# Altium schematic symbol library jlcpcb_2025_04_inductors_extended_0603.schlib: 1269 symbols (part 4 of 7) (continued)
## LQW18AN24NJ00D
designator L?  Inductance: 24nH
Inductor, 24nH, ±5%, 210mΩ, 500mA, SMD 0603; Manufacturer: Murata Electronics; Manufacturer Part Number: LQW18AN24NJ00D; Package Size: 0603; JLCPCB Basic Part: No; JLCPCB Part Number: C701183; Supplier 1: LCSC; Category: Inductors; Supplier Part Number 1: C701183; Tolerance: ±5%; Rated Current: 500mA; DC Resistance: 210mΩ; RoHS: Yes; ComponentLink1Description: Datasheet; ComponentLink1URL: https://wmsc.lcsc.com/wmsc/upload/file/pdf/v2/lcsc/2009291135_Murata-Electronics-LQW18AN24NJ00D_C701183.pdf; ComponentLink2Description: JLCPCB Part URL; ComponentLink2URL: https://jlcpcb.com/partdetail/C701183; ComponentLink3Description: LCSC Part URL; ComponentLink3URL: https://lcsc.com/product-detail/Power-Inductors_Murata-Electronics-Murata-Electronics-LQW18AN24NJ00D_C701183.html
footprint IND-0603 (0603 (1608M) Inductor)
pins: 1, 2

## LQW18AN27NG00D
designator L?  Inductance: 27nH
Inductor, 27nH, ±2%, 210mΩ, SMD 0603; Manufacturer: Murata Electronics; Manufacturer Part Number: LQW18AN27NG00D; Self-Resonant Frequency: 3.7GHz; Q Factor: 40@250MHz; Package Size: 0603; JLCPCB Basic Part: No; JLCPCB Part Number: C148128; Supplier 1: LCSC; Category: Inductors; Supplier Part Number 1: C148128; Tolerance: ±2%; DC Resistance: 210mΩ; RoHS: Yes; ComponentLink1Description: Datasheet; ComponentLink1URL: https://wmsc.lcsc.com/wmsc/upload/file/pdf/v2/lcsc/2304140030_Murata-Electronics-LQW18AN27NG00D_C148128.pdf; ComponentLink2Description: JLCPCB Part URL; ComponentLink2URL: https://jlcpcb.com/partdetail/C148128; ComponentLink3Description: LCSC Part URL; ComponentLink3URL: https://lcsc.com/product-detail/Inductors-SMD_Murata-Electronics-Murata-Electronics-LQW18AN27NG00D_C148128.html
footprint IND-0603 (0603 (1608M) Inductor)
pins: 1, 2

## LQW18AN27NG10D
designator L?  Inductance: 27nH
Inductor, 27nH, ±2%, 116mΩ, 590mA, SMD 0603; Manufacturer: Murata Electronics; Manufacturer Part Number: LQW18AN27NG10D; Package Size: 0603; JLCPCB Basic Part: No; JLCPCB Part Number: C701182; Supplier 1: LCSC; Category: Inductors; Supplier Part Number 1: C701182; Tolerance: ±2%; Rated Current: 590mA; DC Resistance: 116mΩ; RoHS: Yes; ComponentLink1Description: Datasheet; ComponentLink1URL: https://wmsc.lcsc.com/wmsc/upload/file/pdf/v2/lcsc/2012161910_Murata-Electronics-LQW18AN27NG10D_C701182.pdf; ComponentLink2Description: JLCPCB Part URL; ComponentLink2URL: https://jlcpcb.com/partdetail/C701182; ComponentLink3Description: LCSC Part URL; ComponentLink3URL: https://lcsc.com/product-detail/Power-Inductors_Murata-Electronics-Murata-Electronics-LQW18AN27NG10D_C701182.html
footprint IND-0603 (0603 (1608M) Inductor)
pins: 1, 2

## LQW18AN27NJ00D
designator L?  Inductance: 27nH
Inductor, 27nH, ±5%, 210mΩ, 440mA, SMD 0603; Manufacturer: Murata Electronics; Manufacturer Part Number: LQW18AN27NJ00D; Self-Resonant Frequency: 3.7GHz; Q Factor: 40@250MHz; Package Size: 0603; JLCPCB Basic Part: No; JLCPCB Part Number: C98072; Supplier 1: LCSC; Category: Inductors; Supplier Part Number 1: C98072; Tolerance: ±5%; Rated Current: 440mA; DC Resistance: 210mΩ; RoHS: Yes; ComponentLink1Description: Datasheet; ComponentLink1URL: https://wmsc.lcsc.com/wmsc/upload/file/pdf/v2/lcsc/2304140030_Murata-Electronics-LQW18AN27NJ00D_C98072.pdf; ComponentLink2Description: JLCPCB Part URL; ComponentLink2URL: https://jlcpcb.com/partdetail/C98072; ComponentLink3Description: LCSC Part URL; ComponentLink3URL: https://lcsc.com/product-detail/Inductors-SMD_Murata-Electronics-Murata-Electronics-LQW18AN27NJ00D_C98072.html
footprint IND-0603 (0603 (1608M) Inductor)
pins: 1, 2

## LQW18AN30NG00D
designator L?  Inductance: 30nH
Inductor, 30nH, ±2%, 230mΩ, 420mA, SMD 0603; Manufacturer: Murata Electronics; Manufacturer Part Number: LQW18AN30NG00D; Package Size: 0603; JLCPCB Basic Part: No; JLCPCB Part Number: C701195; Supplier 1: LCSC; Category: Inductors; Supplier Part Number 1: C701195; Tolerance: ±2%; Rated Current: 420mA; DC Resistance: 230mΩ; RoHS: Yes; ComponentLink1Description: Datasheet; ComponentLink1URL: https://wmsc.lcsc.com/wmsc/upload/file/pdf/v2/lcsc/2010201503_Murata-Electronics-LQW18AN30NG00D_C701195.pdf; ComponentLink2Description: JLCPCB Part URL; ComponentLink2URL: https://jlcpcb.com/partdetail/C701195; ComponentLink3Description: LCSC Part URL; ComponentLink3URL: https://lcsc.com/product-detail/Power-Inductors_Murata-Electronics-Murata-Electronics-LQW18AN30NG00D_C701195.html
footprint IND-0603 (0603 (1608M) Inductor)
pins: 1, 2

## LQW18AN30NJ00D
designator L?  Inductance: 30nH
Inductor, 30nH, ±5%, 230mΩ, 420mA, SMD 0603; Manufacturer: Murata Electronics; Manufacturer Part Number: LQW18AN30NJ00D; Package Size: 0603; JLCPCB Basic Part: No; JLCPCB Part Number: C185513; Supplier 1: LCSC; Category: Inductors; Supplier Part Number 1: C185513; Tolerance: ±5%; Rated Current: 420mA; DC Resistance: 230mΩ; RoHS: Yes; ComponentLink1Description: Datasheet; ComponentLink1URL: https://wmsc.lcsc.com/wmsc/upload/file/pdf/v2/lcsc/2010101433_Murata-Electronics-LQW18AN30NJ00D_C185513.pdf; ComponentLink2Description: JLCPCB Part URL; ComponentLink2URL: https://jlcpcb.com/partdetail/C185513; ComponentLink3Description: LCSC Part URL; ComponentLink3URL: https://lcsc.com/product-detail/Power-Inductors_Murata-Electronics-Murata-Electronics-LQW18AN30NJ00D_C185513.html
footprint IND-0603 (0603 (1608M) Inductor)
pins: 1, 2

## LQW18AN33NG00D
designator L?  Inductance: 33nH
Inductor, 33nH, ±2%, 230mΩ, 420mA, SMD 0603; Manufacturer: Murata Electronics; Manufacturer Part Number: LQW18AN33NG00D; Self-Resonant Frequency: 3.2GHz; Q Factor: 40@250MHz; Package Size: 0603; JLCPCB Basic Part: No; JLCPCB Part Number: C98073; Supplier 1: LCSC; Category: Inductors; Supplier Part Number 1: C98073; Tolerance: ±2%; Rated Current: 420mA; DC Resistance: 230mΩ; RoHS: Yes; ComponentLink1Description: Datasheet; ComponentLink1URL: https://wmsc.lcsc.com/wmsc/upload/file/pdf/v2/lcsc/2304140030_Murata-Electronics-LQW18AN33NG00D_C98073.pdf; ComponentLink2Description: JLCPCB Part URL; ComponentLink2URL: https://jlcpcb.com/partdetail/C98073; ComponentLink3Description: LCSC Part URL; ComponentLink3URL: https://lcsc.com/product-detail/Inductors-SMD_Murata-Electronics-Murata-Electronics-LQW18AN33NG00D_C98073.html
footprint IND-0603 (0603 (1608M) Inductor)
pins: 1, 2

## LQW18AN33NJ00D
designator L?  Inductance: 33nH
Inductor, 33nH, ±5%, 230mΩ, 420mA, SMD 0603; Manufacturer: Murata Electronics; Manufacturer Part Number: LQW18AN33NJ00D; Self-Resonant Frequency: 3.2GHz; Q Factor: 40@250MHz; Package Size: 0603; JLCPCB Basic Part: No; JLCPCB Part Number: C98074; Supplier 1: LCSC; Category: Inductors; Supplier Part Number 1: C98074; Tolerance: ±5%; Rated Current: 420mA; DC Resistance: 230mΩ; RoHS: Yes; ComponentLink1Description: Datasheet; ComponentLink1URL: https://wmsc.lcsc.com/wmsc/upload/file/pdf/v2/lcsc/2304140030_Murata-Electronics-LQW18AN33NJ00D_C98074.pdf; ComponentLink2Description: JLCPCB Part URL; ComponentLink2URL: https://jlcpcb.com/partdetail/C98074; ComponentLink3Description: LCSC Part URL; ComponentLink3URL: https://lcsc.com/product-detail/Inductors-SMD_Murata-Electronics-Murata-Electronics-LQW18AN33NJ00D_C98074.html
footprint IND-0603 (0603 (1608M) Inductor)
pins: 1, 2

## LQW18AN33NJ10D
designator L?  Inductance: 33nH
Inductor, 33nH, ±5%, 132mΩ, 550mA, SMD 0603; Manufacturer: Murata Electronics; Manufacturer Part Number: LQW18AN33NJ10D; Package Size: 0603; JLCPCB Basic Part: No; JLCPCB Part Number: C701171; Supplier 1: LCSC; Category: Inductors; Supplier Part Number 1: C701171; Tolerance: ±5%; Rated Current: 550mA; DC Resistance: 132mΩ; RoHS: Yes; ComponentLink1Description: Datasheet; ComponentLink1URL: https://wmsc.lcsc.com/wmsc/upload/file/pdf/v2/lcsc/2009241508_Murata-Electronics-LQW18AN33NJ10D_C701171.pdf; ComponentLink2Description: JLCPCB Part URL; ComponentLink2URL: https://jlcpcb.com/partdetail/C701171; ComponentLink3Description: LCSC Part URL; ComponentLink3URL: https://lcsc.com/product-detail/Power-Inductors_Murata-Electronics-Murata-Electronics-LQW18AN33NJ10D_C701171.html
footprint IND-0603 (0603 (1608M) Inductor)
pins: 1, 2

## LQW18AN36NG00D
designator L?  Inductance: 36nH
Inductor, 36nH, ±2%, 260mΩ, SMD 0603; Manufacturer: Murata Electronics; Manufacturer Part Number: LQW18AN36NG00D; Self-Resonant Frequency: 2.9GHz; Q Factor: 40@250MHz; Package Size: 0603; JLCPCB Basic Part: No; JLCPCB Part Number: C113124; Supplier 1: LCSC; Category: Inductors; Supplier Part Number 1: C113124; Tolerance: ±2%; DC Resistance: 260mΩ; RoHS: Yes; ComponentLink1Description: Datasheet; ComponentLink1URL: https://wmsc.lcsc.com/wmsc/upload/file/pdf/v2/lcsc/2304140030_Murata-Electronics-LQW18AN36NG00D_C113124.pdf; ComponentLink2Description: JLCPCB Part URL; ComponentLink2URL: https://jlcpcb.com/partdetail/C113124; ComponentLink3Description: LCSC Part URL; ComponentLink3URL: https://lcsc.com/product-detail/Inductors-SMD_Murata-Electronics-Murata-Electronics-LQW18AN36NG00D_C113124.html
footprint IND-0603 (0603 (1608M) Inductor)
pins: 1, 2

## LQW18AN36NJ00D
designator L?  Inductance: 36nH
Inductor, 36nH, ±5%, 260mΩ, 400mA, SMD 0603; Manufacturer: Murata Electronics; Manufacturer Part Number: LQW18AN36NJ00D; Package Size: 0603; JLCPCB Basic Part: No; JLCPCB Part Number: C440242; Supplier 1: LCSC; Category: Inductors; Supplier Part Number 1: C440242; Tolerance: ±5%; Rated Current: 400mA; DC Resistance: 260mΩ; RoHS: Yes; ComponentLink1Description: Datasheet; ComponentLink1URL: https://wmsc.lcsc.com/wmsc/upload/file/pdf/v2/lcsc/2304140030_Murata-Electronics-LQW18AN36NJ00D_C440242.pdf; ComponentLink2Description: JLCPCB Part URL; ComponentLink2URL: https://jlcpcb.com/partdetail/C440242; ComponentLink3Description: LCSC Part URL; ComponentLink3URL: https://lcsc.com/product-detail/Power-Inductors_Murata-Electronics-Murata-Electronics-LQW18AN36NJ00D_C440242.html
footprint IND-0603 (0603 (1608M) Inductor)
pins: 1, 2

## LQW18AN39NG00D
designator L?  Inductance: 39nH
Inductor, 39nH, ±2%, 260mΩ, 400mA, SMD 0603; Manufacturer: Murata Electronics; Manufacturer Part Number: LQW18AN39NG00D; Self-Resonant Frequency: 2.8GHz; Q Factor: 40@250MHz; Package Size: 0603; JLCPCB Basic Part: No; JLCPCB Part Number: C86134; Supplier 1: LCSC; Category: Inductors; Supplier Part Number 1: C86134; Tolerance: ±2%; Rated Current: 400mA; DC Resistance: 260mΩ; RoHS: Yes; ComponentLink1Description: Datasheet; ComponentLink1URL: https://wmsc.lcsc.com/wmsc/upload/file/pdf/v2/lcsc/1810311111_Murata-Electronics-LQW18AN39NG00D_C86134.pdf; ComponentLink2Description: JLCPCB Part URL; ComponentLink2URL: https://jlcpcb.com/partdetail/C86134; ComponentLink3Description: LCSC Part URL; ComponentLink3URL: https://lcsc.com/product-detail/Inductors-SMD_Murata-Electronics-Murata-Electronics-LQW18AN39NG00D_C86134.html
footprint IND-0603 (0603 (1608M) Inductor)
pins: 1, 2

## LQW18AN39NG80D
designator L?  Inductance: 39nH
Inductor, 39nH, ±2%, 160mΩ, 1A, SMD 0603; Manufacturer: Murata Electronics; Manufacturer Part Number: LQW18AN39NG80D; Package Size: 0603; JLCPCB Basic Part: No; JLCPCB Part Number: C2042966; Supplier 1: LCSC; Category: Inductors; Supplier Part Number 1: C2042966; Tolerance: ±2%; Rated Current: 1A; DC Resistance: 160mΩ; RoHS: Yes; ComponentLink1Description: Datasheet; ComponentLink1URL: https://wmsc.lcsc.com/wmsc/upload/file/pdf/v2/lcsc/2304140030_Murata-Electronics-LQW18AN39NG80D_C2042966.pdf; ComponentLink2Description: JLCPCB Part URL; ComponentLink2URL: https://jlcpcb.com/partdetail/C2042966; ComponentLink3Description: LCSC Part URL; ComponentLink3URL: https://lcsc.com/product-detail/Power-Inductors_Murata-Electronics-Murata-Electronics-LQW18AN39NG80D_C2042966.html
footprint IND-0603 (0603 (1608M) Inductor)
pins: 1, 2

## LQW18AN39NJ00D
designator L?  Inductance: 39nH
Inductor, 39nH, ±5%, 260mΩ, SMD 0603; Manufacturer: Murata Electronics; Manufacturer Part Number: LQW18AN39NJ00D; Self-Resonant Frequency: 2.8GHz; Q Factor: 40@250MHz; Package Size: 0603; JLCPCB Basic Part: No; JLCPCB Part Number: C98075; Supplier 1: LCSC; Category: Inductors; Supplier Part Number 1: C98075; Tolerance: ±5%; DC Resistance: 260mΩ; RoHS: Yes; ComponentLink1Description: Datasheet; ComponentLink1URL: https://wmsc.lcsc.com/wmsc/upload/file/pdf/v2/lcsc/2304140030_Murata-Electronics-LQW18AN39NJ00D_C98075.pdf; ComponentLink2Description: JLCPCB Part URL; ComponentLink2URL: https://jlcpcb.com/partdetail/C98075; ComponentLink3Description: LCSC Part URL; ComponentLink3URL: https://lcsc.com/product-detail/Inductors-SMD_Murata-Electronics-Murata-Electronics-LQW18AN39NJ00D_C98075.html
footprint IND-0603 (0603 (1608M) Inductor)
pins: 1, 2

## LQW18AN41NJ8ZD
designator L?  Inductance: 41nH
Inductor, 41nH, ±5%, 160mΩ, 1A, SMD 0603; Manufacturer: Murata Electronics; Manufacturer Part Number: LQW18AN41NJ8ZD; Package Size: 0603; JLCPCB Basic Part: No; JLCPCB Part Number: C2041928; Supplier 1: LCSC; Category: Inductors; Supplier Part Number 1: C2041928; Tolerance: ±5%; Rated Current: 1A; DC Resistance: 160mΩ; RoHS: Yes; ComponentLink1Description: Datasheet; ComponentLink1URL: https://wmsc.lcsc.com/wmsc/upload/file/pdf/v2/lcsc/2304140030_Murata-Electronics-LQW18AN41NJ8ZD_C2041928.pdf; ComponentLink2Description: JLCPCB Part URL; ComponentLink2URL: https://jlcpcb.com/partdetail/C2041928; ComponentLink3Description: LCSC Part URL; ComponentLink3URL: https://lcsc.com/product-detail/Power-Inductors_Murata-Electronics-Murata-Electronics-LQW18AN41NJ8ZD_C2041928.html
footprint IND-0603 (0603 (1608M) Inductor)
pins: 1, 2

## LQW18AN43NG00D
designator L?  Inductance: 43nH
Inductor, 43nH, ±2%, 290mΩ, 380mA, SMD 0603; Manufacturer: Murata Electronics; Manufacturer Part Number: LQW18AN43NG00D; Self-Resonant Frequency: 2.7GHz; Q Factor: 40@200MHz; Package Size: 0603; JLCPCB Basic Part: No; JLCPCB Part Number: C113126; Supplier 1: LCSC; Category: Inductors; Supplier Part Number 1: C113126; Tolerance: ±2%; Rated Current: 380mA; DC Resistance: 290mΩ; RoHS: Yes; ComponentLink1Description: Datasheet; ComponentLink1URL: https://wmsc.lcsc.com/wmsc/upload/file/pdf/v2/lcsc/2304140030_Murata-Electronics-LQW18AN43NG00D_C113126.pdf; ComponentLink2Description: JLCPCB Part URL; ComponentLink2URL: https://jlcpcb.com/partdetail/C113126; ComponentLink3Description: LCSC Part URL; ComponentLink3URL: https://lcsc.com/product-detail/Inductors-SMD_Murata-Electronics-Murata-Electronics-LQW18AN43NG00D_C113126.html
footprint IND-0603 (0603 (1608M) Inductor)
pins: 1, 2

## LQW18AN43NJ00D
designator L?  Inductance: 43nH
Inductor, 43nH, ±5%, 290mΩ, SMD 0603; Manufacturer: Murata Electronics; Manufacturer Part Number: LQW18AN43NJ00D; Self-Resonant Frequency: 2.7GHz; Q Factor: 40@200MHz; Package Size: 0603; JLCPCB Basic Part: No; JLCPCB Part Number: C162646; Supplier 1: LCSC; Category: Inductors; Supplier Part Number 1: C162646; Tolerance: ±5%; DC Resistance: 290mΩ; RoHS: Yes; ComponentLink1Description: Datasheet; ComponentLink1URL: https://wmsc.lcsc.com/wmsc/upload/file/pdf/v2/lcsc/2304140030_Murata-Electronics-LQW18AN43NJ00D_C162646.pdf; ComponentLink2Description: JLCPCB Part URL; ComponentLink2URL: https://jlcpcb.com/partdetail/C162646; ComponentLink3Description: LCSC Part URL; ComponentLink3URL: https://lcsc.com/product-detail/Inductors-SMD_Murata-Electronics-Murata-Electronics-LQW18AN43NJ00D_C162646.html
footprint IND-0603 (0603 (1608M) Inductor)
pins: 1, 2

## LQW18AN47NG00D
designator L?  Inductance: 47nH
Inductor, 47nH, ±2%, 290mΩ, 380mA, SMD 0603; Manufacturer: Murata Electronics; Manufacturer Part Number: LQW18AN47NG00D; Self-Resonant Frequency: 2.6GHz; Q Factor: 38@200MHz; Package Size: 0603; JLCPCB Basic Part: No; JLCPCB Part Number: C98076; Supplier 1: LCSC; Category: Inductors; Supplier Part Number 1: C98076; Tolerance: ±2%; Rated Current: 380mA; DC Resistance: 290mΩ; RoHS: Yes; ComponentLink1Description: Datasheet; ComponentLink1URL: https://wmsc.lcsc.com/wmsc/upload/file/pdf/v2/lcsc/2304140030_Murata-Electronics-LQW18AN47NG00D_C98076.pdf; ComponentLink2Description: JLCPCB Part URL; ComponentLink2URL: https://jlcpcb.com/partdetail/C98076; ComponentLink3Description: LCSC Part URL; ComponentLink3URL: https://lcsc.com/product-detail/Inductors-SMD_Murata-Electronics-Murata-Electronics-LQW18AN47NG00D_C98076.html
footprint IND-0603 (0603 (1608M) Inductor)
pins: 1, 2

## LQW18AN47NJ00D
designator L?  Inductance: 47nH
Inductor, 47nH, ±5%, 290mΩ, SMD 0603; Manufacturer: Murata Electronics; Manufacturer Part Number: LQW18AN47NJ00D; Self-Resonant Frequency: 2.6GHz; Q Factor: 38@200MHz; Package Size: 0603; JLCPCB Basic Part: No; JLCPCB Part Number: C98077; Supplier 1: LCSC; Category: Inductors; Supplier Part Number 1: C98077; Tolerance: ±5%; DC Resistance: 290mΩ; RoHS: Yes; ComponentLink1Description: Datasheet; ComponentLink1URL: https://wmsc.lcsc.com/wmsc/upload/file/pdf/v2/lcsc/2304140030_Murata-Electronics-LQW18AN47NJ00D_C98077.pdf; ComponentLink2Description: JLCPCB Part URL; ComponentLink2URL: https://jlcpcb.com/partdetail/C98077; ComponentLink3Description: LCSC Part URL; ComponentLink3URL: https://lcsc.com/product-detail/Inductors-SMD_Murata-Electronics-Murata-Electronics-LQW18AN47NJ00D_C98077.html
footprint IND-0603 (0603 (1608M) Inductor)
pins: 1, 2

## LQW18AN51NG00D
designator L?  Inductance: 51nH
Inductor, 51nH, ±2%, 330mΩ, 370mA, SMD 0603; Manufacturer: Murata Electronics; Manufacturer Part Number: LQW18AN51NG00D; Self-Resonant Frequency: 2.5GHz; Q Factor: 38@200MHz; Package Size: 0603; JLCPCB Basic Part: No; JLCPCB Part Number: C162648; Supplier 1: LCSC; Category: Inductors; Supplier Part Number 1: C162648; Tolerance: ±2%; Rated Current: 370mA; DC Resistance: 330mΩ; RoHS: Yes; ComponentLink1Description: Datasheet; ComponentLink1URL: https://wmsc.lcsc.com/wmsc/upload/file/pdf/v2/lcsc/1810311126_Murata-Electronics-LQW18AN51NG00D_C162648.pdf; ComponentLink2Description: JLCPCB Part URL; ComponentLink2URL: https://jlcpcb.com/partdetail/C162648; ComponentLink3Description: LCSC Part URL; ComponentLink3URL: https://lcsc.com/product-detail/Inductors-SMD_Murata-Electronics-Murata-Electronics-LQW18AN51NG00D_C162648.html
footprint IND-0603 (0603 (1608M) Inductor)
pins: 1, 2

## LQW18AN52NG8ZD
designator L?  Inductance: 52nH
Inductor, 52nH, ±2%, 270mΩ, 750mA, SMD 0603; Manufacturer: Murata Electronics; Manufacturer Part Number: LQW18AN52NG8ZD; Package Size: 0603; JLCPCB Basic Part: No; JLCPCB Part Number: C2043013; Supplier 1: LCSC; Category: Inductors; Supplier Part Number 1: C2043013; Tolerance: ±2%; Rated Current: 750mA; DC Resistance: 270mΩ; RoHS: Yes; ComponentLink1Description: Datasheet; ComponentLink1URL: https://wmsc.lcsc.com/wmsc/upload/file/pdf/v2/lcsc/2304140030_Murata-Electronics-LQW18AN52NG8ZD_C2043013.pdf; ComponentLink2Description: JLCPCB Part URL; ComponentLink2URL: https://jlcpcb.com/partdetail/C2043013; ComponentLink3Description: LCSC Part URL; ComponentLink3URL: https://lcsc.com/product-detail/Power-Inductors_Murata-Electronics-Murata-Electronics-LQW18AN52NG8ZD_C2043013.html
footprint IND-0603 (0603 (1608M) Inductor)
pins: 1, 2

## LQW18AN56NG00D
designator L?  Inductance: 56nH
Inductor, 56nH, ±2%, 350mΩ, 360mA, SMD 0603; Manufacturer: Murata Electronics; Manufacturer Part Number: LQW18AN56NG00D; Self-Resonant Frequency: 2.4GHz; Q Factor: 38@200MHz; Package Size: 0603; JLCPCB Basic Part: No; JLCPCB Part Number: C98079; Supplier 1: LCSC; Category: Inductors; Supplier Part Number 1: C98079; Tolerance: ±2%; Rated Current: 360mA; DC Resistance: 350mΩ; RoHS: Yes; ComponentLink1Description: Datasheet; ComponentLink1URL: https://wmsc.lcsc.com/wmsc/upload/file/pdf/v2/lcsc/2304140030_Murata-Electronics-LQW18AN56NG00D_C98079.pdf; ComponentLink2Description: JLCPCB Part URL; ComponentLink2URL: https://jlcpcb.com/partdetail/C98079; ComponentLink3Description: LCSC Part URL; ComponentLink3URL: https://lcsc.com/product-detail/Inductors-SMD_Murata-Electronics-Murata-Electronics-LQW18AN56NG00D_C98079.html
footprint IND-0603 (0603 (1608M) Inductor)
pins: 1, 2

## LQW18AN56NG8ZD
designator L?  Inductance: 56nH
Inductor, 56nH, ±2%, 260mΩ, 770mA, SMD 0603; Manufacturer: Murata Electronics; Manufacturer Part Number: LQW18AN56NG8ZD; Self-Resonant Frequency: 2.6GHz; Q Factor: 38@200MHz; Package Size: 0603; JLCPCB Basic Part: No; JLCPCB Part Number: C2044171; Supplier 1: LCSC; Category: Inductors; Supplier Part Number 1: C2044171; Tolerance: ±2%; Rated Current: 770mA; DC Resistance: 260mΩ; RoHS: Yes; ComponentLink1Description: Datasheet; ComponentLink1URL: https://wmsc.lcsc.com/wmsc/upload/file/pdf/v2/lcsc/2304140030_Murata-Electronics-LQW18AN56NG8ZD_C2044171.pdf; ComponentLink2Description: JLCPCB Part URL; ComponentLink2URL: https://jlcpcb.com/partdetail/C2044171; ComponentLink3Description: LCSC Part URL; ComponentLink3URL: https://lcsc.com/product-detail/Inductors-SMD_Murata-Electronics-Murata-Electronics-LQW18AN56NG8ZD_C2044171.html
footprint IND-0603 (0603 (1608M) Inductor)
pins: 1, 2

## LQW18AN56NJ00D
designator L?  Inductance: 56nH
Inductor, 56nH, ±5%, 350mΩ, 360mA, SMD 0603; Manufacturer: Murata Electronics; Manufacturer Part Number: LQW18AN56NJ00D; Self-Resonant Frequency: 2.4GHz; Q Factor: 38@200MHz; Package Size: 0603; JLCPCB Basic Part: No; JLCPCB Part Number: C98080; Supplier 1: LCSC; Category: Inductors; Supplier Part Number 1: C98080; Tolerance: ±5%; Rated Current: 360mA; DC Resistance: 350mΩ; RoHS: Yes; ComponentLink1Description: Datasheet; ComponentLink1URL: https://wmsc.lcsc.com/wmsc/upload/file/pdf/v2/lcsc/2304140030_Murata-Electronics-LQW18AN56NJ00D_C98080.pdf; ComponentLink2Description: JLCPCB Part URL; ComponentLink2URL: https://jlcpcb.com/partdetail/C98080; ComponentLink3Description: LCSC Part URL; ComponentLink3URL: https://lcsc.com/product-detail/Inductors-SMD_Murata-Electronics-Murata-Electronics-LQW18AN56NJ00D_C98080.html
footprint IND-0603 (0603 (1608M) Inductor)
pins: 1, 2

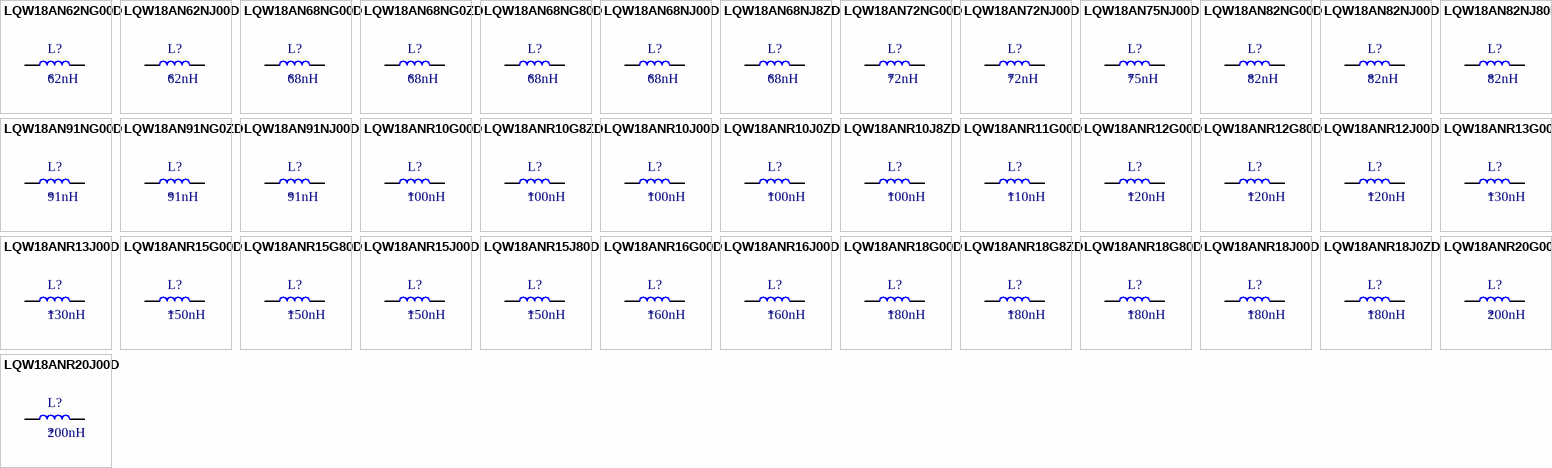
[diagram p16: symbols LQW18AN62NG00D to LQW18ANR20J00D]

## LQW18AN62NG00D
designator L?  Inductance: 62nH
Inductor, 62nH, ±2%, 510mΩ, 280mA, SMD 0603; Manufacturer: Murata Electronics; Manufacturer Part Number: LQW18AN62NG00D; Self-Resonant Frequency: 2.3GHz; Q Factor: 38@200MHz; Package Size: 0603; JLCPCB Basic Part: No; JLCPCB Part Number: C162649; Supplier 1: LCSC; Category: Inductors; Supplier Part Number 1: C162649; Tolerance: ±2%; Rated Current: 280mA; DC Resistance: 510mΩ; RoHS: Yes; ComponentLink1Description: Datasheet; ComponentLink1URL: https://wmsc.lcsc.com/wmsc/upload/file/pdf/v2/lcsc/1810311126_Murata-Electronics-LQW18AN62NG00D_C162649.pdf; ComponentLink2Description: JLCPCB Part URL; ComponentLink2URL: https://jlcpcb.com/partdetail/C162649; ComponentLink3Description: LCSC Part URL; ComponentLink3URL: https://lcsc.com/product-detail/Inductors-SMD_Murata-Electronics-Murata-Electronics-LQW18AN62NG00D_C162649.html
footprint IND-0603 (0603 (1608M) Inductor)
pins: 1, 2

## LQW18AN62NJ00D
designator L?  Inductance: 62nH
Inductor, 62nH, ±5%, 510mΩ, 280mA, SMD 0603; Manufacturer: Murata Electronics; Manufacturer Part Number: LQW18AN62NJ00D; Package Size: 0603; JLCPCB Basic Part: No; JLCPCB Part Number: C701192; Supplier 1: LCSC; Category: Inductors; Supplier Part Number 1: C701192; Tolerance: ±5%; Rated Current: 280mA; DC Resistance: 510mΩ; RoHS: Yes; ComponentLink1Description: Datasheet; ComponentLink1URL: https://wmsc.lcsc.com/wmsc/upload/file/pdf/v2/lcsc/2009091507_Murata-Electronics-LQW18AN62NJ00D_C701192.pdf; ComponentLink2Description: JLCPCB Part URL; ComponentLink2URL: https://jlcpcb.com/partdetail/C701192; ComponentLink3Description: LCSC Part URL; ComponentLink3URL: https://lcsc.com/product-detail/Power-Inductors_Murata-Electronics-Murata-Electronics-LQW18AN62NJ00D_C701192.html
footprint IND-0603 (0603 (1608M) Inductor)
pins: 1, 2

## LQW18AN68NG00D
designator L?  Inductance: 68nH
Inductor, 68nH, ±2%, 380mΩ, 340mA, SMD 0603; Manufacturer: Murata Electronics; Manufacturer Part Number: LQW18AN68NG00D; Self-Resonant Frequency: 2.2GHz; Q Factor: 38@200MHz; Package Size: 0603; JLCPCB Basic Part: No; JLCPCB Part Number: C86135; Supplier 1: LCSC; Category: Inductors; Supplier Part Number 1: C86135; Tolerance: ±2%; Rated Current: 340mA; DC Resistance: 380mΩ; RoHS: Yes; ComponentLink1Description: Datasheet; ComponentLink1URL: https://wmsc.lcsc.com/wmsc/upload/file/pdf/v2/lcsc/1810311111_Murata-Electronics-LQW18AN68NG00D_C86135.pdf; ComponentLink2Description: JLCPCB Part URL; ComponentLink2URL: https://jlcpcb.com/partdetail/C86135; ComponentLink3Description: LCSC Part URL; ComponentLink3URL: https://lcsc.com/product-detail/Inductors-SMD_Murata-Electronics-Murata-Electronics-LQW18AN68NG00D_C86135.html
footprint IND-0603 (0603 (1608M) Inductor)
pins: 1, 2

## LQW18AN68NG0ZD
designator L?  Inductance: 68nH
Inductor, 68nH, ±2%, 380mΩ, 340mA, SMD 0603; Manufacturer: Murata Electronics; Manufacturer Part Number: LQW18AN68NG0ZD; Package Size: 0603; JLCPCB Basic Part: No; JLCPCB Part Number: C2048554; Supplier 1: LCSC; Category: Inductors; Supplier Part Number 1: C2048554; Tolerance: ±2%; Rated Current: 340mA; DC Resistance: 380mΩ; RoHS: Yes; ComponentLink1Description: Datasheet; ComponentLink1URL: https://wmsc.lcsc.com/wmsc/upload/file/pdf/v2/lcsc/2304140030_Murata-Electronics-LQW18AN68NG0ZD_C2048554.pdf; ComponentLink2Description: JLCPCB Part URL; ComponentLink2URL: https://jlcpcb.com/partdetail/C2048554; ComponentLink3Description: LCSC Part URL; ComponentLink3URL: https://lcsc.com/product-detail/Power-Inductors_Murata-Electronics-Murata-Electronics-LQW18AN68NG0ZD_C2048554.html
footprint IND-0603 (0603 (1608M) Inductor)
pins: 1, 2

## LQW18AN68NG80D
designator L?  Inductance: 68nH
Inductor, 68nH, ±2%, 380mΩ, 630mA, SMD 0603; Manufacturer: Murata Electronics; Manufacturer Part Number: LQW18AN68NG80D; Package Size: 0603; JLCPCB Basic Part: No; JLCPCB Part Number: C3224367; Supplier 1: LCSC; Category: Inductors; Supplier Part Number 1: C3224367; Tolerance: ±2%; Rated Current: 630mA; DC Resistance: 380mΩ; RoHS: Yes; ComponentLink1Description: Datasheet; ComponentLink1URL: https://wmsc.lcsc.com/wmsc/upload/file/pdf/v2/lcsc/2311301508_Murata-Electronics-LQW18AN68NG80D_C3224367.pdf; ComponentLink2Description: JLCPCB Part URL; ComponentLink2URL: https://jlcpcb.com/partdetail/C3224367; ComponentLink3Description: LCSC Part URL; ComponentLink3URL: https://lcsc.com/product-detail/Inductors-SMD_Murata-Electronics-Murata-Electronics-LQW18AN68NG80D_C3224367.html
footprint IND-0603 (0603 (1608M) Inductor)
pins: 1, 2

## LQW18AN68NJ00D
designator L?  Inductance: 68nH
Inductor, 68nH, ±5%, 380mΩ, SMD 0603; Manufacturer: Murata Electronics; Manufacturer Part Number: LQW18AN68NJ00D; Self-Resonant Frequency: 2.2GHz; Q Factor: 38@200MHz; Package Size: 0603; JLCPCB Basic Part: No; JLCPCB Part Number: C98082; Supplier 1: LCSC; Category: Inductors; Supplier Part Number 1: C98082; Tolerance: ±5%; DC Resistance: 380mΩ; RoHS: Yes; ComponentLink1Description: Datasheet; ComponentLink1URL: https://wmsc.lcsc.com/wmsc/upload/file/pdf/v2/lcsc/2304140030_Murata-Electronics-LQW18AN68NJ00D_C98082.pdf; ComponentLink2Description: JLCPCB Part URL; ComponentLink2URL: https://jlcpcb.com/partdetail/C98082; ComponentLink3Description: LCSC Part URL; ComponentLink3URL: https://lcsc.com/product-detail/Inductors-SMD_Murata-Electronics-Murata-Electronics-LQW18AN68NJ00D_C98082.html
footprint IND-0603 (0603 (1608M) Inductor)
pins: 1, 2

## LQW18AN68NJ8ZD
designator L?  Inductance: 68nH
Inductor, 68nH, ±5%, 380mΩ, 630mA, SMD 0603; Manufacturer: Murata Electronics; Manufacturer Part Number: LQW18AN68NJ8ZD; Package Size: 0603; JLCPCB Basic Part: No; JLCPCB Part Number: C2041952; Supplier 1: LCSC; Category: Inductors; Supplier Part Number 1: C2041952; Tolerance: ±5%; Rated Current: 630mA; DC Resistance: 380mΩ; RoHS: Yes; ComponentLink1Description: Datasheet; ComponentLink1URL: https://wmsc.lcsc.com/wmsc/upload/file/pdf/v2/lcsc/2304140030_Murata-Electronics-LQW18AN68NJ8ZD_C2041952.pdf; ComponentLink2Description: JLCPCB Part URL; ComponentLink2URL: https://jlcpcb.com/partdetail/C2041952; ComponentLink3Description: LCSC Part URL; ComponentLink3URL: https://lcsc.com/product-detail/Power-Inductors_Murata-Electronics-Murata-Electronics-LQW18AN68NJ8ZD_C2041952.html
footprint IND-0603 (0603 (1608M) Inductor)
pins: 1, 2

## LQW18AN72NG00D
designator L?  Inductance: 72nH
Inductor, 72nH, ±2%, 560mΩ, 270mA, SMD 0603; Manufacturer: Murata Electronics; Manufacturer Part Number: LQW18AN72NG00D; Package Size: 0603; JLCPCB Basic Part: No; JLCPCB Part Number: C701181; Supplier 1: LCSC; Category: Inductors; Supplier Part Number 1: C701181; Tolerance: ±2%; Rated Current: 270mA; DC Resistance: 560mΩ; RoHS: Yes; ComponentLink1Description: Datasheet; ComponentLink1URL: https://wmsc.lcsc.com/wmsc/upload/file/pdf/v2/lcsc/2010302208_Murata-Electronics-LQW18AN72NG00D_C701181.pdf; ComponentLink2Description: JLCPCB Part URL; ComponentLink2URL: https://jlcpcb.com/partdetail/C701181; ComponentLink3Description: LCSC Part URL; ComponentLink3URL: https://lcsc.com/product-detail/Power-Inductors_Murata-Electronics-Murata-Electronics-LQW18AN72NG00D_C701181.html
footprint IND-0603 (0603 (1608M) Inductor)
pins: 1, 2

## LQW18AN72NJ00D
designator L?  Inductance: 72nH
Inductor, 72nH, ±5%, 560mΩ, 270mA, SMD 0603; Manufacturer: Murata Electronics; Manufacturer Part Number: LQW18AN72NJ00D; Package Size: 0603; JLCPCB Basic Part: No; JLCPCB Part Number: C269833; Supplier 1: LCSC; Category: Inductors; Supplier Part Number 1: C269833; Tolerance: ±5%; Rated Current: 270mA; DC Resistance: 560mΩ; RoHS: Yes; ComponentLink1Description: Datasheet; ComponentLink1URL: https://wmsc.lcsc.com/wmsc/upload/file/pdf/v2/lcsc/2308111513_Murata-Electronics-LQW18AN72NJ00D_C269833.pdf; ComponentLink2Description: JLCPCB Part URL; ComponentLink2URL: https://jlcpcb.com/partdetail/C269833; ComponentLink3Description: LCSC Part URL; ComponentLink3URL: https://lcsc.com/product-detail/Power-Inductors_Murata-Electronics-Murata-Electronics-LQW18AN72NJ00D_C269833.html
footprint IND-0603 (0603 (1608M) Inductor)
pins: 1, 2

## LQW18AN75NJ00D
designator L?  Inductance: 75nH
Inductor, 75nH, ±5%, 560mΩ, 270mA, SMD 0603; Manufacturer: Murata Electronics; Manufacturer Part Number: LQW18AN75NJ00D; Package Size: 0603; JLCPCB Basic Part: No; JLCPCB Part Number: C913701; Supplier 1: LCSC; Category: Inductors; Supplier Part Number 1: C913701; Tolerance: ±5%; Rated Current: 270mA; DC Resistance: 560mΩ; RoHS: Yes; ComponentLink1Description: Datasheet; ComponentLink1URL: https://wmsc.lcsc.com/wmsc/upload/file/pdf/v2/lcsc/2304140030_Murata-Electronics-LQW18AN75NJ00D_C913701.pdf; ComponentLink2Description: JLCPCB Part URL; ComponentLink2URL: https://jlcpcb.com/partdetail/C913701; ComponentLink3Description: LCSC Part URL; ComponentLink3URL: https://lcsc.com/product-detail/Power-Inductors_Murata-Electronics-Murata-Electronics-LQW18AN75NJ00D_C913701.html
footprint IND-0603 (0603 (1608M) Inductor)
pins: 1, 2

## LQW18AN82NG00D
designator L?  Inductance: 82nH
Inductor, 82nH, ±2%, 600mΩ, SMD 0603; Manufacturer: Murata Electronics; Manufacturer Part Number: LQW18AN82NG00D; Self-Resonant Frequency: 2GHz; Q Factor: 34@150MHz; Package Size: 0603; JLCPCB Basic Part: No; JLCPCB Part Number: C98085; Supplier 1: LCSC; Category: Inductors; Supplier Part Number 1: C98085; Tolerance: ±2%; DC Resistance: 600mΩ; RoHS: Yes; ComponentLink1Description: Datasheet; ComponentLink1URL: https://wmsc.lcsc.com/wmsc/upload/file/pdf/v2/lcsc/2304140030_Murata-Electronics-LQW18AN82NG00D_C98085.pdf; ComponentLink2Description: JLCPCB Part URL; ComponentLink2URL: https://jlcpcb.com/partdetail/C98085; ComponentLink3Description: LCSC Part URL; ComponentLink3URL: https://lcsc.com/product-detail/Inductors-SMD_Murata-Electronics-Murata-Electronics-LQW18AN82NG00D_C98085.html
footprint IND-0603 (0603 (1608M) Inductor)
pins: 1, 2

## LQW18AN82NJ00D
designator L?  Inductance: 82nH
Inductor, 82nH, ±5%, 600mΩ, 250mA, SMD 0603; Manufacturer: Murata Electronics; Manufacturer Part Number: LQW18AN82NJ00D; Self-Resonant Frequency: 2GHz; Q Factor: 34@150MHz; Package Size: 0603; JLCPCB Basic Part: No; JLCPCB Part Number: C98086; Supplier 1: LCSC; Category: Inductors; Supplier Part Number 1: C98086; Tolerance: ±5%; Rated Current: 250mA; DC Resistance: 600mΩ; RoHS: Yes; ComponentLink1Description: Datasheet; ComponentLink1URL: https://wmsc.lcsc.com/wmsc/upload/file/pdf/v2/lcsc/2304140030_Murata-Electronics-LQW18AN82NJ00D_C98086.pdf; ComponentLink2Description: JLCPCB Part URL; ComponentLink2URL: https://jlcpcb.com/partdetail/C98086; ComponentLink3Description: LCSC Part URL; ComponentLink3URL: https://lcsc.com/product-detail/Inductors-SMD_Murata-Electronics-Murata-Electronics-LQW18AN82NJ00D_C98086.html
footprint IND-0603 (0603 (1608M) Inductor)
pins: 1, 2

## LQW18AN82NJ80D
designator L?  Inductance: 82nH
Inductor, 82nH, ±5%, 500mΩ, SMD 0603; Manufacturer: Murata Electronics; Manufacturer Part Number: LQW18AN82NJ80D; Self-Resonant Frequency: 2.23GHz; Q Factor: 34@150MHz; Package Size: 0603; JLCPCB Basic Part: No; JLCPCB Part Number: C307611; Supplier 1: LCSC; Category: Inductors; Supplier Part Number 1: C307611; Tolerance: ±5%; DC Resistance: 500mΩ; RoHS: Yes; ComponentLink1Description: Datasheet; ComponentLink1URL: https://wmsc.lcsc.com/wmsc/upload/file/pdf/v2/lcsc/2304140030_Murata-Electronics-LQW18AN82NJ80D_C307611.pdf; ComponentLink2Description: JLCPCB Part URL; ComponentLink2URL: https://jlcpcb.com/partdetail/C307611; ComponentLink3Description: LCSC Part URL; ComponentLink3URL: https://lcsc.com/product-detail/Inductors-SMD_Murata-Electronics-Murata-Electronics-LQW18AN82NJ80D_C307611.html
footprint IND-0603 (0603 (1608M) Inductor)
pins: 1, 2

## LQW18AN91NG00D
designator L?  Inductance: 91nH
Inductor, 91nH, ±2%, 640mΩ, 230mA, SMD 0603; Manufacturer: Murata Electronics; Manufacturer Part Number: LQW18AN91NG00D; Package Size: 0603; JLCPCB Basic Part: No; JLCPCB Part Number: C189920; Supplier 1: LCSC; Category: Inductors; Supplier Part Number 1: C189920; Tolerance: ±2%; Rated Current: 230mA; DC Resistance: 640mΩ; RoHS: Yes; ComponentLink1Description: Datasheet; ComponentLink1URL: https://wmsc.lcsc.com/wmsc/upload/file/pdf/v2/lcsc/2304140030_Murata-Electronics-LQW18AN91NG00D_C189920.pdf; ComponentLink2Description: JLCPCB Part URL; ComponentLink2URL: https://jlcpcb.com/partdetail/C189920; ComponentLink3Description: LCSC Part URL; ComponentLink3URL: https://lcsc.com/product-detail/Power-Inductors_Murata-Electronics-Murata-Electronics-LQW18AN91NG00D_C189920.html
footprint IND-0603 (0603 (1608M) Inductor)
pins: 1, 2

## LQW18AN91NG0ZD
designator L?  Inductance: 91nH
Inductor, 91nH, ±2%, 640mΩ, SMD 0603; Manufacturer: Murata Electronics; Manufacturer Part Number: LQW18AN91NG0ZD; Self-Resonant Frequency: 1.9GHz; Q Factor: 34@150MHz; Package Size: 0603; JLCPCB Basic Part: No; JLCPCB Part Number: C237546; Supplier 1: LCSC; Category: Inductors; Supplier Part Number 1: C237546; Tolerance: ±2%; DC Resistance: 640mΩ; RoHS: Yes; ComponentLink1Description: Datasheet; ComponentLink1URL: https://wmsc.lcsc.com/wmsc/upload/file/pdf/v2/lcsc/2304140030_Murata-Electronics-LQW18AN91NG0ZD_C237546.pdf; ComponentLink2Description: JLCPCB Part URL; ComponentLink2URL: https://jlcpcb.com/partdetail/C237546; ComponentLink3Description: LCSC Part URL; ComponentLink3URL: https://lcsc.com/product-detail/Inductors-SMD_Murata-Electronics-Murata-Electronics-LQW18AN91NG0ZD_C237546.html
footprint IND-0603 (0603 (1608M) Inductor)
pins: 1, 2

## LQW18AN91NJ00D
designator L?  Inductance: 91nH
Inductor, 91nH, ±5%, 640mΩ, 230mA, SMD 0603; Manufacturer: Murata Electronics; Manufacturer Part Number: LQW18AN91NJ00D; Self-Resonant Frequency: 1.9GHz; Q Factor: 34@150MHz; Package Size: 0603; JLCPCB Basic Part: No; JLCPCB Part Number: C389572; Supplier 1: LCSC; Category: Inductors; Supplier Part Number 1: C389572; Tolerance: ±5%; Rated Current: 230mA; DC Resistance: 640mΩ; RoHS: Yes; ComponentLink1Description: Datasheet; ComponentLink1URL: https://wmsc.lcsc.com/wmsc/upload/file/pdf/v2/lcsc/1912111437_Murata-Electronics-LQW18AN91NJ00D_C389572.pdf; ComponentLink2Description: JLCPCB Part URL; ComponentLink2URL: https://jlcpcb.com/partdetail/C389572; ComponentLink3Description: LCSC Part URL; ComponentLink3URL: https://lcsc.com/product-detail/Inductors-SMD_Murata-Electronics-Murata-Electronics-LQW18AN91NJ00D_C389572.html
footprint IND-0603 (0603 (1608M) Inductor)
pins: 1, 2

## LQW18ANR10G00D
designator L?  Inductance: 100nH
Inductor, 100nH, ±2%, 680mΩ, 220mA, SMD 0603; Manufacturer: Murata Electronics; Manufacturer Part Number: LQW18ANR10G00D; Self-Resonant Frequency: 1.8GHz; Q Factor: 34@150MHz; Package Size: 0603; JLCPCB Basic Part: No; JLCPCB Part Number: C98088; Supplier 1: LCSC; Category: Inductors; Supplier Part Number 1: C98088; Tolerance: ±2%; Rated Current: 220mA; DC Resistance: 680mΩ; RoHS: Yes; ComponentLink1Description: Datasheet; ComponentLink1URL: https://wmsc.lcsc.com/wmsc/upload/file/pdf/v2/lcsc/2304140030_Murata-Electronics-LQW18ANR10G00D_C98088.pdf; ComponentLink2Description: JLCPCB Part URL; ComponentLink2URL: https://jlcpcb.com/partdetail/C98088; ComponentLink3Description: LCSC Part URL; ComponentLink3URL: https://lcsc.com/product-detail/Inductors-SMD_Murata-Electronics-Murata-Electronics-LQW18ANR10G00D_C98088.html
footprint IND-0603 (0603 (1608M) Inductor)
pins: 1, 2

## LQW18ANR10G8ZD
designator L?  Inductance: 100nH
Inductor, 100nH, ±2%, 630mΩ, 490mA, SMD 0603; Manufacturer: Murata Electronics; Manufacturer Part Number: LQW18ANR10G8ZD; Package Size: 0603; JLCPCB Basic Part: No; JLCPCB Part Number: C2044297; Supplier 1: LCSC; Category: Inductors; Supplier Part Number 1: C2044297; Tolerance: ±2%; Rated Current: 490mA; DC Resistance: 630mΩ; RoHS: Yes; ComponentLink1Description: Datasheet; ComponentLink1URL: https://wmsc.lcsc.com/wmsc/upload/file/pdf/v2/lcsc/2304140030_Murata-Electronics-LQW18ANR10G8ZD_C2044297.pdf; ComponentLink2Description: JLCPCB Part URL; ComponentLink2URL: https://jlcpcb.com/partdetail/C2044297; ComponentLink3Description: LCSC Part URL; ComponentLink3URL: https://lcsc.com/product-detail/Power-Inductors_Murata-Electronics-Murata-Electronics-LQW18ANR10G8ZD_C2044297.html
footprint IND-0603 (0603 (1608M) Inductor)
pins: 1, 2

## LQW18ANR10J00D
designator L?  Inductance: 100nH
Inductor, 100nH, ±5%, 680mΩ, 220mA, SMD 0603; Manufacturer: Murata Electronics; Manufacturer Part Number: LQW18ANR10J00D; Self-Resonant Frequency: 1.8GHz; Q Factor: 34@150MHz; Package Size: 0603; JLCPCB Basic Part: No; JLCPCB Part Number: C98089; Supplier 1: LCSC; Category: Inductors; Supplier Part Number 1: C98089; Tolerance: ±5%; Rated Current: 220mA; DC Resistance: 680mΩ; RoHS: Yes; ComponentLink1Description: Datasheet; ComponentLink1URL: https://wmsc.lcsc.com/wmsc/upload/file/pdf/v2/lcsc/2304140030_Murata-Electronics-LQW18ANR10J00D_C98089.pdf; ComponentLink2Description: JLCPCB Part URL; ComponentLink2URL: https://jlcpcb.com/partdetail/C98089; ComponentLink3Description: LCSC Part URL; ComponentLink3URL: https://lcsc.com/product-detail/Inductors-SMD_Murata-Electronics-Murata-Electronics-LQW18ANR10J00D_C98089.html
footprint IND-0603 (0603 (1608M) Inductor)
pins: 1, 2

## LQW18ANR10J0ZD
designator L?  Inductance: 100nH
Inductor, 100nH, ±5%, 680mΩ, SMD 0603; Manufacturer: Murata Electronics; Manufacturer Part Number: LQW18ANR10J0ZD; Self-Resonant Frequency: 1.8GHz; Q Factor: 34@150MHz; Package Size: 0603; JLCPCB Basic Part: No; JLCPCB Part Number: C435421; Supplier 1: LCSC; Category: Inductors; Supplier Part Number 1: C435421; Tolerance: ±5%; DC Resistance: 680mΩ; RoHS: Yes; ComponentLink1Description: Datasheet; ComponentLink1URL: https://wmsc.lcsc.com/wmsc/upload/file/pdf/v2/lcsc/2304140030_Murata-Electronics-LQW18ANR10J0ZD_C435421.pdf; ComponentLink2Description: JLCPCB Part URL; ComponentLink2URL: https://jlcpcb.com/partdetail/C435421; ComponentLink3Description: LCSC Part URL; ComponentLink3URL: https://lcsc.com/product-detail/Inductors-SMD_Murata-Electronics-Murata-Electronics-LQW18ANR10J0ZD_C435421.html
footprint IND-0603 (0603 (1608M) Inductor)
pins: 1, 2

## LQW18ANR10J8ZD
designator L?  Inductance: 100nH
Inductor, 100nH, ±5%, 630mΩ, 490mA, SMD 0603; Manufacturer: Murata Electronics; Manufacturer Part Number: LQW18ANR10J8ZD; Package Size: 0603; JLCPCB Basic Part: No; JLCPCB Part Number: C560066; Supplier 1: LCSC; Category: Inductors; Supplier Part Number 1: C560066; Tolerance: ±5%; Rated Current: 490mA; DC Resistance: 630mΩ; RoHS: Yes; ComponentLink1Description: Datasheet; ComponentLink1URL: https://wmsc.lcsc.com/wmsc/upload/file/pdf/v2/lcsc/2304140030_Murata-Electronics-LQW18ANR10J8ZD_C560066.pdf; ComponentLink2Description: JLCPCB Part URL; ComponentLink2URL: https://jlcpcb.com/partdetail/C560066; ComponentLink3Description: LCSC Part URL; ComponentLink3URL: https://lcsc.com/product-detail/Power-Inductors_Murata-Electronics-Murata-Electronics-LQW18ANR10J8ZD_C560066.html
footprint IND-0603 (0603 (1608M) Inductor)
pins: 1, 2

## LQW18ANR11G00D
designator L?  Inductance: 110nH
Inductor, 110nH, ±2%, 1.2Ω, 200mA, SMD 0603; Manufacturer: Murata Electronics; Manufacturer Part Number: LQW18ANR11G00D; Self-Resonant Frequency: 1.7GHz; Q Factor: 32@150MHz; Package Size: 0603; JLCPCB Basic Part: No; JLCPCB Part Number: C113130; Supplier 1: LCSC; Category: Inductors; Supplier Part Number 1: C113130; Tolerance: ±2%; Rated Current: 200mA; DC Resistance: 1.2Ω; RoHS: Yes; ComponentLink1Description: Datasheet; ComponentLink1URL: https://wmsc.lcsc.com/wmsc/upload/file/pdf/v2/lcsc/2304140030_Murata-Electronics-LQW18ANR11G00D_C113130.pdf; ComponentLink2Description: JLCPCB Part URL; ComponentLink2URL: https://jlcpcb.com/partdetail/C113130; ComponentLink3Description: LCSC Part URL; ComponentLink3URL: https://lcsc.com/product-detail/Inductors-SMD_Murata-Electronics-Murata-Electronics-LQW18ANR11G00D_C113130.html
footprint IND-0603 (0603 (1608M) Inductor)
pins: 1, 2

## LQW18ANR12G00D
designator L?  Inductance: 120nH
Inductor, 120nH, ±2%, 1.3Ω, 180mA, SMD 0603; Manufacturer: Murata Electronics; Manufacturer Part Number: LQW18ANR12G00D; Self-Resonant Frequency: 1.6GHz; Q Factor: 32@150MHz; Package Size: 0603; JLCPCB Basic Part: No; JLCPCB Part Number: C86138; Supplier 1: LCSC; Category: Inductors; Supplier Part Number 1: C86138; Tolerance: ±2%; Rated Current: 180mA; DC Resistance: 1.3Ω; RoHS: Yes; ComponentLink1Description: Datasheet; ComponentLink1URL: https://wmsc.lcsc.com/wmsc/upload/file/pdf/v2/lcsc/1810311122_Murata-Electronics-LQW18ANR12G00D_C86138.pdf; ComponentLink2Description: JLCPCB Part URL; ComponentLink2URL: https://jlcpcb.com/partdetail/C86138; ComponentLink3Description: LCSC Part URL; ComponentLink3URL: https://lcsc.com/product-detail/Inductors-SMD_Murata-Electronics-Murata-Electronics-LQW18ANR12G00D_C86138.html
footprint IND-0603 (0603 (1608M) Inductor)
pins: 1, 2

## LQW18ANR12G80D
designator L?  Inductance: 120nH
Inductor, 120nH, ±2%, 720mΩ, SMD 0603; Manufacturer: Murata Electronics; Manufacturer Part Number: LQW18ANR12G80D; Self-Resonant Frequency: 1.65GHz; Q Factor: 32@150MHz; Package Size: 0603; JLCPCB Basic Part: No; JLCPCB Part Number: C307612; Supplier 1: LCSC; Category: Inductors; Supplier Part Number 1: C307612; Tolerance: ±2%; DC Resistance: 720mΩ; RoHS: Yes; ComponentLink1Description: Datasheet; ComponentLink1URL: https://wmsc.lcsc.com/wmsc/upload/file/pdf/v2/lcsc/2304140030_Murata-Electronics-LQW18ANR12G80D_C307612.pdf; ComponentLink2Description: JLCPCB Part URL; ComponentLink2URL: https://jlcpcb.com/partdetail/C307612; ComponentLink3Description: LCSC Part URL; ComponentLink3URL: https://lcsc.com/product-detail/Inductors-SMD_Murata-Electronics-Murata-Electronics-LQW18ANR12G80D_C307612.html
footprint IND-0603 (0603 (1608M) Inductor)
pins: 1, 2

## LQW18ANR12J00D
designator L?  Inductance: 120nH
Inductor, 120nH, ±5%, 1.3Ω, 180mA, SMD 0603; Manufacturer: Murata Electronics; Manufacturer Part Number: LQW18ANR12J00D; Self-Resonant Frequency: 1.6GHz; Q Factor: 32@150MHz; Package Size: 0603; JLCPCB Basic Part: No; JLCPCB Part Number: C341697; Supplier 1: LCSC; Category: Inductors; Supplier Part Number 1: C341697; Tolerance: ±5%; Rated Current: 180mA; DC Resistance: 1.3Ω; RoHS: Yes; ComponentLink1Description: Datasheet; ComponentLink1URL: https://wmsc.lcsc.com/wmsc/upload/file/pdf/v2/lcsc/2304140030_Murata-Electronics-LQW18ANR12J00D_C341697.pdf; ComponentLink2Description: JLCPCB Part URL; ComponentLink2URL: https://jlcpcb.com/partdetail/C341697; ComponentLink3Description: LCSC Part URL; ComponentLink3URL: https://lcsc.com/product-detail/Inductors-SMD_Murata-Electronics-Murata-Electronics-LQW18ANR12J00D_C341697.html
footprint IND-0603 (0603 (1608M) Inductor)
pins: 1, 2

## LQW18ANR13G00D
designator L?  Inductance: 130nH
Inductor, 130nH, ±2%, 1.4Ω, 170mA, SMD 0603; Manufacturer: Murata Electronics; Manufacturer Part Number: LQW18ANR13G00D; Package Size: 0603; JLCPCB Basic Part: No; JLCPCB Part Number: C307613; Supplier 1: LCSC; Category: Inductors; Supplier Part Number 1: C307613; Tolerance: ±2%; Rated Current: 170mA; DC Resistance: 1.4Ω; RoHS: Yes; ComponentLink1Description: Datasheet; ComponentLink1URL: https://wmsc.lcsc.com/wmsc/upload/file/pdf/v2/lcsc/2308111514_Murata-Electronics-LQW18ANR13G00D_C307613.pdf; ComponentLink2Description: JLCPCB Part URL; ComponentLink2URL: https://jlcpcb.com/partdetail/C307613; ComponentLink3Description: LCSC Part URL; ComponentLink3URL: https://lcsc.com/product-detail/Power-Inductors_Murata-Electronics-Murata-Electronics-LQW18ANR13G00D_C307613.html
footprint IND-0603 (0603 (1608M) Inductor)
pins: 1, 2
